# Altium footprint library Footprints.PcbLib: 76 footprints (part 3 of 5)
Each footprint in its own frame and in the unit in brackets; x right, y up, seen from the top. Pads: shape width x height; smd on the part's side, far side on the other; paste and mask are expansions set on the pad; w line width, h text height; cw(c..) or ccw(c..) is an arc to the next point about the centre after c.
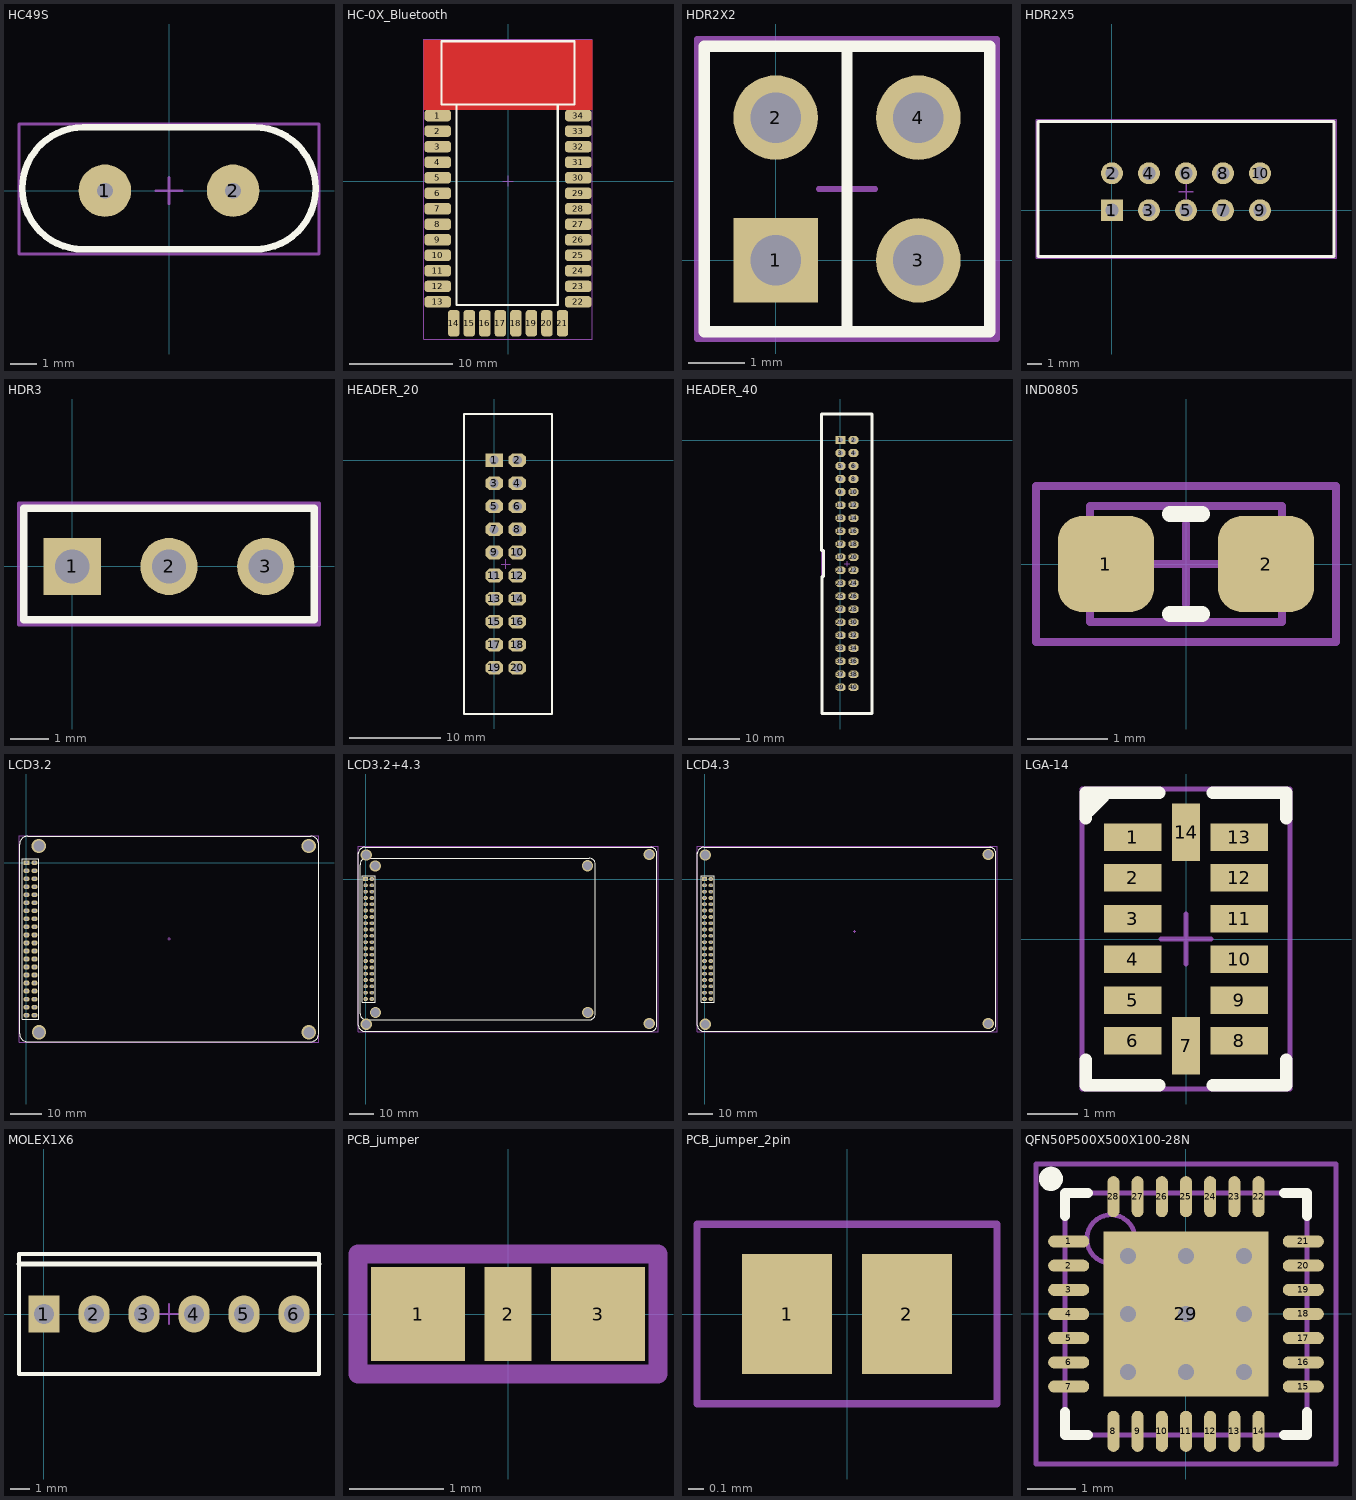
[diagram p2: the footprints below, top view; thin cyan lines are the x and y axes]

## HC49S [mm]
height 5
pads (3):
  oct 0x0 smd paste+0 mask+0: 0(0,0)
  round 2 hole 0.6: 1(-2.44,0) 2(2.44,0)
Top Overlay:
  lines w0.254: -3.265,-2.237 cw(c-3.265,0.088) -3.265,2.413 3.265,2.413 cw(c3.265,0.088) 3.265,-2.237 -3.265,-2.237
Mechanical 15:
  lines w0.1: -0.5,0 0.5,0 ; 0,-0.5 0,0.5 ; -5.715,-2.413 5.715,-2.413 5.715,2.54 -5.715,2.54 -5.715,-2.413
3D body "User Library-HC49S.STEP": height 3.63, standoff -1.97, extent -5.586,-2.286 5.586,2.387

## HC-0X_Bluetooth [mil] "HC-0X_Bluetooth Module"
height 78.74
pads (34):
  rrect50% 100x43.31 smd: 1(-267,249) 2(-267,190) 3(-267,131) 4(-267,72) 5(-267,13) 6(-267,-46) 7(-267,-105) 8(-267,-164) 9(-267,-223) 10(-267,-282) 11(-267,-341) 12(-267,-400) 13(-267,-459) 22(267,-459) 23(267,-400) 24(267,-341) 25(267,-282) 26(267,-223) 27(267,-164) 28(267,-105) 29(267,-46) 30(267,13) 31(267,72) 32(267,131) 33(267,190) 34(267,249)
  rrect50% 43.31x100 smd: 14(-206,-540) 15(-147,-540) 16(-88,-540) 17(-29,-540) 18(30,-540) 19(89,-540) 20(148,-540) 21(207,-540)
Top Layer:
  pour cut-out: -254,271 -320,271 -320,535 320,535 320,272.01
Top Overlay:
  lines w7.87: -195,291 -195,-470 -12,-470 189,-470 189,291 ; -251.97,291 -251.97,531.5 251.97,531.5 251.97,291 -251.97,291
Mechanical 15:
  lines w3.94: -19.68,0 19.68,0 ; 0,-19.68 0,19.68 ; -320,-600 320,-600 320,540 -320,540 -320,-600
3D body "User Library-Bluetooth HC-06_.step": height 92.52, standoff 0, extent -272.05,-531.5 279.92,571.26

## HDR2X2 [mm] "Connector; Header; 2x2 Position"
height 8
pads (4):
  rect 1.5x1.5 hole 0.9: 1(0,0)
  round 1.5 hole 0.9: 2(0,2.54) 3(2.54,0) 4(2.54,2.54)
Top Overlay:
  lines w0.2: 1.27,-1.27 1.27,3.81 ; -1.27,-1.27 3.81,-1.27 3.81,3.81 -1.27,3.81 -1.27,-1.27
Mechanical 15:
  lines w0.1: 0.77,1.27 1.77,1.27 ; 1.27,0.77 1.27,1.77 ; -1.397,-1.397 3.937,-1.397 3.937,3.937 -1.397,3.937 -1.397,-1.397
3D body "PLD-4.step": height 8.5, standoff -3, extent -1.27,-1.182 3.81,3.818

## HDR2X5 [mm] "Connector; Header; 5x2 Position"
pads (10):
  rect 1.5x1.5 hole 0.9: 1(0,0)
  round 1.5 hole 0.9: 2(0,2.54) 3(2.54,0) 4(2.54,2.54) 5(5.08,0) 6(5.08,2.54) 7(7.62,0) 8(7.62,2.54) 9(10.16,0) 10(10.16,2.54)
Top Overlay:
  lines w0.2: -5.08,-3.175 -5.08,6.096 15.24,6.096 15.24,-3.175 -5.08,-3.175
Mechanical 15:
  lines w0.1: 4.58,1.27 5.58,1.27 ; 5.08,0.77 5.08,1.77 ; -5.207,-3.302 -5.207,6.223 15.367,6.223 15.367,-3.302 -5.207,-3.302
3D body "User Library-IDC-10M.STEP": height 9.3, standoff -3.1, extent -5.07,-3.13 15.23,5.97

## HDR3 [mm] "Connector; Header; 3 Position"
height 8
pads (3):
  rect 1.5x1.5 hole 0.9: 1(0,0)
  round 1.5 hole 0.9: 2(2.54,0) 3(5.08,0)
Top Overlay:
  lines w0.2: -1.27,-1.397 6.35,-1.397 6.35,1.524 -1.27,1.524 -1.27,-1.397
Mechanical 15:
  lines w0.1: 2.04,0 3.04,0 ; 2.54,-0.5 2.54,0.5 ; -1.397,-1.524 -1.397,1.651 6.477,1.651 6.477,-1.524 -1.397,-1.524
3D body "PinHeaderX3.STEP": height 8.53, standoff -3.68, extent -1.27,-1.396 6.35,1.524

## HEADER_20 [mm]
pads (20):
  rect 1.9x1.5 hole 1: 1(0,0)
  oct 1.9x1.5 hole 1: 2(2.54,0) 3(0,-2.54) 4(2.54,-2.54) 5(0,-5.08) 6(2.54,-5.08) 7(0,-7.62) 8(2.54,-7.62) 9(0,-10.16) 10(2.54,-10.16) 11(0,-12.7) 12(2.54,-12.7) 13(0,-15.24) 14(2.54,-15.24) 15(0,-17.78) 16(2.54,-17.78) 17(0,-20.32) 18(2.54,-20.32) 19(0,-22.86) 20(2.54,-22.86)
Top Overlay:
  lines w0.2: -3.302,-27.94 6.35,-27.94 6.35,5.08 -1.905,5.08 -3.302,5.08 -3.302,-27.94
Mechanical 15:
  lines w0.1: 0.77,-11.43 1.77,-11.43 ; 1.27,-11.93 1.27,-10.93 ; -3.302,-27.94 -3.302,5.08 6.35,5.08 6.35,-27.94 -3.302,-27.94
3D body "LP20V.STEP": height 9.46, standoff -3.2, extent -3.18,-27.94 6.02,5.08

## HEADER_40 [mm]
height 6
pads (40):
  rect 1.9x1.5 hole 1: 1(0,0)
  oct 1.9x1.5 hole 1: 2(2.54,0) 3(0,-2.54) 4(2.54,-2.54) 5(0,-5.08) 6(2.54,-5.08) 7(0,-7.62) 8(2.54,-7.62) 9(0,-10.16) 10(2.54,-10.16) 11(0,-12.7) 12(2.54,-12.7) 13(0,-15.24) 14(2.54,-15.24) 15(0,-17.78) 16(2.54,-17.78) 17(0,-20.32) 18(2.54,-20.32) 19(0,-22.86) 20(2.54,-22.86)
  oct 1.9x1.5 hole 1 paste+0: 21(0,-25.4) 22(2.54,-25.4) 23(0,-27.94) 24(2.54,-27.94) 25(0,-30.48) 26(2.54,-30.48) 27(0,-33.02) 28(2.54,-33.02) 29(0,-35.56) 30(2.54,-35.56) 31(0,-38.1) 32(2.54,-38.1) 33(0,-40.64) 34(2.54,-40.64) 35(0,-43.18) 36(2.54,-43.18) 37(0,-45.72) 38(2.54,-45.72) 39(0,-48.26) 40(2.54,-48.26)
Top Overlay:
  lines w0.6: -3.581,-27.559 -3.581,-26.67 ; -3.581,-26.949 -3.581,-29.489 -3.581,-53.34 6.147,-53.34 6.147,5.08 -3.683,5.08 -3.683,-21.59 -3.302,-21.59 -3.302,-26.67
Mechanical 15:
  lines w0.1: 0.77,-24.13 1.77,-24.13 ; 1.27,-24.63 1.27,-23.63 ; -3.683,-53.467 -3.683,5.08 6.223,5.08 6.223,-53.467 -3.683,-53.467
3D body "40pin_header.step": height 9.78, standoff -3.05, extent -3.556,-53.289 6.096,5.029

## IND0805 [mm] "Chip Inductor, 2-Leads, Body 2,3x1,3mm, IPC Medium Density"
height 1
pads (2):
  rrect50% 1.2x1.2 smd: 1(-1,0) 2(1,0)
Top Overlay:
  lines w0.2: -0.2,-0.625 0.2,-0.625 ; -0.2,0.625 0.2,0.625
Mechanical 13:
  lines w0.1: -1.2,-0.725 -1.2,0.725 1.2,0.725 1.2,-0.725 -1.2,-0.725
Mechanical 15:
  lines w0.1: -0.5,0 0.5,0 ; 0,-0.5 0,0.5 ; -1.875,-0.975 -1.875,0.975 1.875,0.975 1.875,-0.975 -1.875,-0.975
3D body "ind_0805.step": height 0.95, standoff 0, extent -1,-0.6 1,0.6

## LCD3.2 [mm] "TFT LCD module 3.2'' sdcard slot"
height 8
pads (40):
  rect 1.9x1.5 hole 1: 1(0,0)
  oct 1.9x1.5 hole 1: 2(0,-2.54) 3(0,-5.08) 4(0,-7.62) 5(0,-10.16) 6(0,-12.7) 7(0,-15.24) 8(0,-17.78) 9(0,-20.32) 10(0,-22.86) 11(0,-25.4) 12(0,-27.94) 13(0,-30.48) 14(0,-33.02) 15(0,-35.56) 16(0,-38.1) 17(0,-40.64) 18(0,-43.18) 19(0,-45.72) 20(0,-48.26)
  oct 1.8x1.5 hole 0.9: 21(2.54,0) 22(2.54,-2.54) 23(2.54,-5.08) 24(2.54,-7.62) 25(2.54,-10.16) 26(2.54,-12.7) 27(2.54,-15.24) 28(2.54,-17.78) 29(2.54,-20.32) 30(2.54,-22.86) 31(2.54,-25.4) 32(2.54,-27.94) 33(2.54,-30.48) 34(2.54,-33.02) 35(2.54,-35.56) 36(2.54,-38.1) 37(2.54,-40.64) 38(2.54,-43.18) 39(2.54,-45.72) 40(2.54,-48.26)
via 3.937,-53.67 diameter 4.5 hole 3.5
via 89.332,-53.67 diameter 4.5 hole 3.5
via 89.281,5.309 diameter 4.5 hole 3.5
via 3.912,5.283 diameter 4.5 hole 3.5
Top Overlay:
  lines w0.254: -2.184,-52.578 -2.184,-10.16 -2.184,5.818 cw(c0.356,5.818) 0.356,8.358 61.697,8.358 89.891,8.358 cw(c89.891,5.818) 92.431,5.818 92.431,-19.304 92.431,-54.102 cw(c89.891,-54.102) 89.891,-56.642 30.074,-56.642 0.356,-56.642 cw(c0.356,-54.102) -2.184,-54.102 -2.184,-47.625 ; -1.27,-49.53 3.81,-49.53 3.81,1.27 -1.27,1.27 -1.27,-49.53
Mechanical 15:
  lines w0.1: 44.63,-24.105 45.63,-24.105 ; 45.13,-24.605 45.13,-23.605 ; -2.362,-56.769 92.558,-56.769 92.558,8.458 -2.362,8.458 -2.362,-56.769
3D body "HEX STANDOFF.step": height 9.53, standoff 0, extent 0.271,-56.845 7.603,-50.495
3D body "HEX STANDOFF.step": height 9.53, standoff 0, extent 85.666,-56.845 92.998,-50.495
3D body "HEX STANDOFF.step": height 9.53, standoff 0, extent 85.615,2.134 92.947,8.484
3D body "HEX STANDOFF.step": height 9.53, standoff 0, extent 0.246,2.108 7.578,8.458
3D body "LCD_module3.2.step": height 14.75, standoff 1.18, extent -2.345,-56.777 92.541,8.494
3D body: height 7, standoff 0, extent -1.27,-49.53 3.81,1.27

## LCD3.2+4.3 [mm] "TFT LCD module unified footprint for 3.2'' and 4.3' sdcard slot"
height 8
pads (40):
  rect 1.9x1.5 hole 1: 1(0,0)
  oct 1.8x1.5 hole 0.9: 2(0,-2.54) 3(0,-5.08) 4(0,-7.62) 5(0,-10.16) 6(0,-12.7) 7(0,-15.24) 8(0,-17.78) 9(0,-20.32) 10(0,-22.86) 11(0,-25.4) 12(0,-27.94) 13(0,-30.48) 14(0,-33.02) 15(0,-35.56) 16(0,-38.1) 17(0,-40.64) 18(0,-43.18) 19(0,-45.72) 20(0,-48.26) 21(2.54,0) 22(2.54,-2.54) 23(2.54,-5.08) 24(2.54,-7.62) 25(2.54,-10.16) 26(2.54,-12.7) 27(2.54,-15.24) 28(2.54,-17.78) 29(2.54,-20.32) 30(2.54,-22.86) 31(2.54,-25.4) 32(2.54,-27.94) 33(2.54,-30.48) 34(2.54,-33.02) 35(2.54,-35.56) 36(2.54,-38.1) 37(2.54,-40.64) 38(2.54,-43.18) 39(2.54,-45.72) 40(2.54,-48.26)
via 0.254,-58.42 diameter 4.5 hole 3.5
via 114.046,-58.166 diameter 4.5 hole 3.5
via 114.046,9.906 diameter 4.5 hole 3.5
via 0.254,9.652 diameter 4.5 hole 3.5
via 3.937,-53.67 diameter 4.5 hole 3.5
via 89.332,-53.67 diameter 4.5 hole 3.5
via 89.281,5.309 diameter 4.5 hole 3.5
via 3.912,5.283 diameter 4.5 hole 3.5
Top Overlay:
  lines w0.254: -2.87,-57.201 -2.87,-14.783 -2.87,10.617 ; -2.87,-52.248 -2.87,-58.725 ccw(c-0.33,-58.725) -0.33,-61.265 29.388,-61.265 114.605,-61.265 ; -2.87,10.195 cw(c-0.33,10.195) -0.33,12.735 61.011,12.735 114.986,12.735 ; -2.184,-52.578 -2.184,-10.16 -2.184,5.818 cw(c0.356,5.818) 0.356,8.358 61.697,8.358 89.891,8.358 cw(c89.891,5.818) 92.431,5.818 92.431,-19.304 92.431,-54.102 cw(c89.891,-54.102) 89.891,-56.642 30.074,-56.642 0.356,-56.642 cw(c0.356,-54.102) -2.184,-54.102 -2.184,-47.625 ; 114.59,-61.265 ccw(c114.59,-58.725) 117.13,-58.725 117.13,-23.927 117.13,10.744 ; 114.59,12.735 cw(c114.59,10.195) 117.13,10.195 ; -1.27,-49.53 -1.27,1.27 ; -1.27,-49.53 3.81,-49.53 ; -1.27,-49.53 3.81,-49.53 ; -1.27,-49.53 -1.27,1.27 ; -1.27,1.27 3.81,1.27 ; -1.27,1.27 3.81,1.27 ; 3.81,-49.53 3.81,1.27 ; 3.81,-49.53 3.81,1.27
Mechanical 15:
  lines w0.1: -3.048,-61.468 117.602,-61.468 117.602,13.208 -3.048,13.208 -3.048,-61.468
3D body "HEX STANDOFF.step": height 9.53, standoff 0, extent 110.38,-61.341 117.712,-54.991
3D body "HEX STANDOFF.step": height 9.53, standoff 0, extent 110.38,6.731 117.712,13.081
3D body "HEX STANDOFF.step": height 9.53, standoff 0, extent -3.412,6.477 3.92,12.827
3D body "HEX STANDOFF.step": height 9.53, standoff 0, extent -3.412,-61.595 3.92,-55.245
3D body "LCD_module4.3.step": height 14.75, standoff 1.18, extent -2.881,-61.25 117.395,13.026
3D body: height 7, standoff 0, extent -1.27,-49.53 3.81,1.27

## LCD4.3 [mm] "TFT LCD module 4.3' sdcard slot"
height 8
pads (40):
  rect 1.9x1.5 hole 1: 1(0,0)
  oct 1.9x1.5 hole 1: 2(0,-2.54) 3(0,-5.08) 4(0,-7.62) 5(0,-10.16) 6(0,-12.7) 7(0,-15.24) 8(0,-17.78) 9(0,-20.32) 10(0,-22.86) 11(0,-25.4) 12(0,-27.94) 13(0,-30.48) 14(0,-33.02) 15(0,-35.56) 16(0,-38.1) 17(0,-40.64) 18(0,-43.18) 19(0,-45.72) 20(0,-48.26)
  oct 1.8x1.5 hole 0.9: 21(2.54,0) 22(2.54,-2.54) 23(2.54,-5.08) 24(2.54,-7.62) 25(2.54,-10.16) 26(2.54,-12.7) 27(2.54,-15.24) 28(2.54,-17.78) 29(2.54,-20.32) 30(2.54,-22.86) 31(2.54,-25.4) 32(2.54,-27.94) 33(2.54,-30.48) 34(2.54,-33.02) 35(2.54,-35.56) 36(2.54,-38.1) 37(2.54,-40.64) 38(2.54,-43.18) 39(2.54,-45.72) 40(2.54,-48.26)
via 0.254,-58.42 diameter 4.5 hole 3.5
via 114.046,-58.166 diameter 4.5 hole 3.5
via 114.046,9.906 diameter 4.5 hole 3.5
via 0.254,9.652 diameter 4.5 hole 3.5
Top Overlay:
  lines w0.254: -2.87,-57.201 -2.87,-14.783 -2.87,10.617 ; -2.87,-52.248 -2.87,-58.725 ccw(c-0.33,-58.725) -0.33,-61.265 29.388,-61.265 114.605,-61.265 ; -2.87,10.195 cw(c-0.33,10.195) -0.33,12.735 61.011,12.735 114.986,12.735 ; 114.59,-61.265 ccw(c114.59,-58.725) 117.13,-58.725 117.13,-23.927 117.13,10.744 ; 114.59,12.735 cw(c114.59,10.195) 117.13,10.195 ; -1.27,-49.53 -1.27,1.27 3.81,1.27 3.81,-49.53 -1.27,-49.53
Mechanical 15:
  lines w0.1: 59.87,-21.057 60.87,-21.057 ; 60.37,-21.557 60.37,-20.557 ; -3.048,-61.468 117.602,-61.468 117.602,13.208 -3.048,13.208 -3.048,-61.468
3D body "HEX STANDOFF.step": height 9.53, standoff 0, extent 110.38,-61.341 117.712,-54.991
3D body "HEX STANDOFF.step": height 9.53, standoff 0, extent 110.38,6.731 117.712,13.081
3D body "HEX STANDOFF.step": height 9.53, standoff 0, extent -3.412,6.477 3.92,12.827
3D body "HEX STANDOFF.step": height 9.53, standoff 0, extent -3.412,-61.595 3.92,-55.245
3D body "LCD_module4.3.step": height 14.75, standoff 1.18, extent -2.881,-61.25 117.395,13.026
3D body: height 7, standoff 0, extent -1.27,-49.53 3.81,1.27

## LGA-14 [mm] "14-Terminal Land Grid Array [LGA] (CC-14-1)"
height 1
pads (14):
  rect 1.145x0.55 smd: 1(-1.067,2.032) 2(-1.067,1.219) 3(-1.067,0.406) 4(-1.067,-0.406) 5(-1.067,-1.219) 6(-1.067,-2.032) 8(1.067,-2.032) 9(1.067,-1.219) 10(1.067,-0.406) 11(1.067,0.406) 12(1.067,1.219) 13(1.067,2.032)
  rect 0.55x1.145 smd: 7(0,-2.134) 14(0,2.134)
Top Overlay:
  lines w0.25: -2.007,-2.413 -2.007,-2.921 -0.533,-2.921 ; -2.007,2.413 -2.007,2.921 -0.533,2.921 ; -2.007,2.642 -1.956,2.642 ; -1.93,2.565 -1.651,2.845 ; 0.533,-2.921 2.007,-2.921 2.007,-2.413 ; 0.533,2.921 2.007,2.921 2.007,2.413
Mechanical 15:
  lines w0.1: -0.5,0 0.5,0 ; 0,-0.5 0,0.5 ; -2.083,-2.997 2.083,-2.997 2.083,2.997 -2.083,2.997 -2.083,-2.997
3D body "LGA-14-1.step": height 0.98, standoff 0, extent -1.5,-2.5 1.5,2.5

## MOLEX1X6 [mm] "Connector; Header; 6 Position"
height 8
pads (6):
  rect 1.6x1.9 hole 1: 1(0,0)
  oval 1.6x1.9 hole 1: 2(2.54,0) 3(5.08,0) 4(7.62,0) 5(10.16,0) 6(12.7,0)
Top Overlay:
  lines w0.2: -1.27,-3.048 13.97,-3.048 13.97,3.048 -1.27,3.048 -1.27,-3.048
  lines w0.254: -1.27,2.54 13.97,2.54
Mechanical 15:
  lines w0.1: 5.85,0 6.85,0 ; 6.35,-0.5 6.35,0.5 ; -1.27,-3.048 13.97,-3.048 13.97,3.048 -1.27,3.048 -1.27,-3.048
3D body "molex kk 0_1in latching 6 way vertical header.step": height 11.8, standoff -3.44, extent -1.27,-2.972 13.97,2.87

## PCB_jumper [mm]
pads (3):
  rect 1x1 smd: 1(-0.953,0) 3(0.953,0)
  rect 0.5x1 smd: 2(0,0)
Mechanical 15:
  lines w0.2: -1.587,-0.635 -1.587,0.635 1.587,0.635 1.587,-0.635 -1.556,-0.635

## PCB_jumper_2pin [mm]
pads (2):
  rect 0.6x0.8 smd: 1(-0.4,0) 2(0.4,0)
Mechanical 15:
  lines w0.05: -1,-0.6 1,-0.6 1,0.6 -1,0.6 -1,-0.6

## QFN50P500X500X100-28N [mm] "QFN, 28-Leads, Body 5,0x5,0mm (max), Pitch 0,50mm, IPC Medium Density"
height 1
pads (29):
  oval 0.85x0.25 smd: 1(-2.425,1.5) 2(-2.425,1) 3(-2.425,0.5) 4(-2.425,0) 5(-2.425,-0.5) 6(-2.425,-1) 7(-2.425,-1.5) 15(2.425,-1.5) 16(2.425,-1) 17(2.425,-0.5) 18(2.425,0) 19(2.425,0.5) 20(2.425,1) 21(2.425,1.5)
  oval 0.25x0.85 smd: 8(-1.5,-2.425) 9(-1,-2.425) 10(-0.5,-2.425) 11(0,-2.425) 12(0.5,-2.425) 13(1,-2.425) 14(1.5,-2.425) 22(1.5,2.425) 23(1,2.425) 24(0.5,2.425) 25(0,2.425) 26(-0.5,2.425) 27(-1,2.425) 28(-1.5,2.425)
  rect 3.4x3.4 smd: 29(0,0)
via 1.2,-1.2 diameter 0.66 hole 0.33
via 0,-1.2 diameter 0.66 hole 0.33
via -1.2,-1.2 diameter 0.66 hole 0.33
via 1.2,0 diameter 0.66 hole 0.33
via 0,0 diameter 0.66 hole 0.33
via -1.2,0 diameter 0.66 hole 0.33
via 1.2,1.2 diameter 0.66 hole 0.33
via 0,1.2 diameter 0.66 hole 0.33
via -1.2,1.2 diameter 0.66 hole 0.33
Top Overlay:
  circle w0.25: c-2.792,2.794 r0.125
  lines w0.2: -2.5,-2.025 -2.5,-2.5 -2.025,-2.5 ; -2.5,2.025 -2.5,2.5 -2.025,2.5 ; 2.025,-2.5 2.5,-2.5 2.5,-2.025 ; 2.025,2.5 2.5,2.5 2.5,2.025
Mechanical 13:
  circle w0.1: c-1.55,1.55 r0.5
  lines w0.1: -2.5,-2.5 2.5,-2.5 2.5,2.5 -2.5,2.5 -2.5,-2.5
Mechanical 15:
  lines w0.1: -0.5,0 0.5,0 ; 0,-0.5 0,0.5 ; -3.1,-3.1 3.1,-3.1 3.1,3.1 -3.1,3.1 -3.1,-3.1
3D body "QFN28.step": height 0.9, standoff 0, extent -2.52,-2.54 2.52,2.5